# Altium footprint library Universal components.PcbLib: 101 footprints (part 7 of 7)
Each footprint in its own frame and in the unit in brackets; x right, y up, seen from the top. Pads: shape width x height; smd on the part's side, far side on the other; paste and mask are expansions set on the pad; w line width, h text height; cw(c..) or ccw(c..) is an arc to the next point about the centre after c.
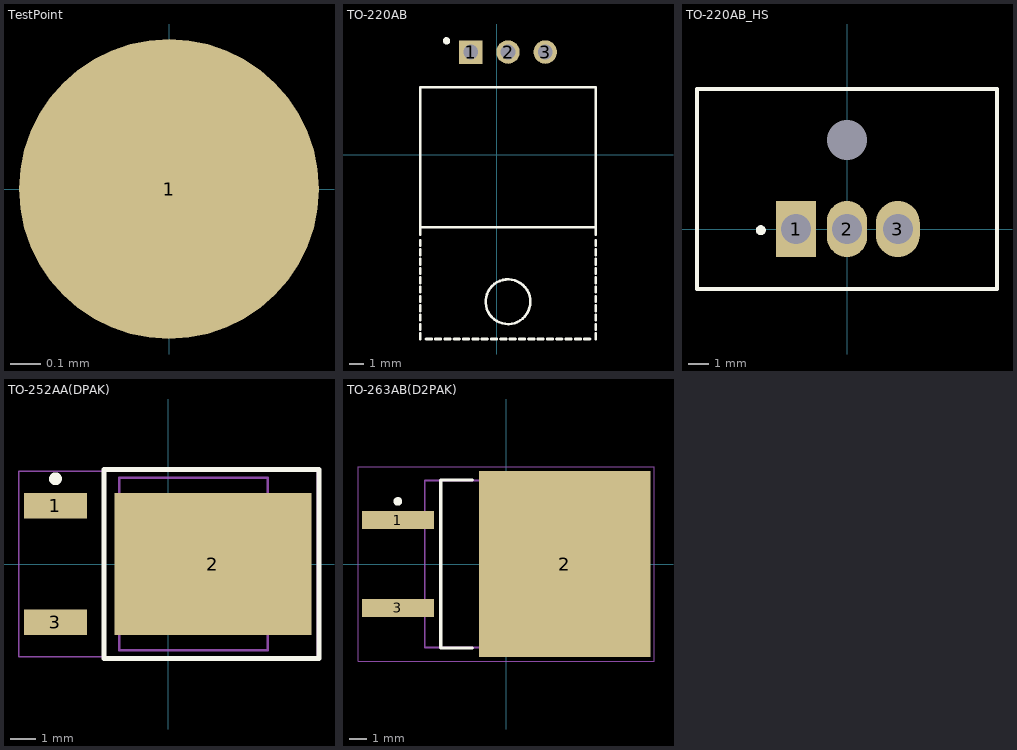
[diagram p6: the footprints below, top view; thin cyan lines are the x and y axes]

## TestPoint [mm]
pads (1):
  round 1 smd: 1(0,0)

## TO-220AB [mm]
pads (3):
  rect 1.6x1.6 hole 1: 1(-1.778,6.985)
  round 1.6 hole 1: 2(0.762,6.985) 3(3.302,6.985)
Top Overlay:
  circle w0.25: c-3.429,7.747 r0.125
  lines w0.178: -5.207,-12.573 -5.207,-12.192 ; -5.207,-11.938 -5.207,-11.557 ; -5.207,-11.303 -5.207,-10.922 ; -5.207,-10.668 -5.207,-10.287 ; -5.207,-10.033 -5.207,-9.652 ; -5.207,-9.398 -5.207,-9.017 ; -5.207,-8.763 -5.207,-8.382 ; -5.207,-8.128 -5.207,-7.747 ; -5.207,-7.493 -5.207,-7.112 ; -5.207,-6.858 -5.207,-6.477 ; -5.207,-6.223 -5.207,-5.842 ; -5.207,-5.461 -5.207,-4.953 ; -4.826,-12.573 -4.445,-12.573 ; -4.191,-12.573 -3.81,-12.573 ; -3.556,-12.573 -3.175,-12.573 ; -2.921,-12.573 -2.54,-12.573 ; -2.286,-12.573 -1.905,-12.573 ; -1.651,-12.573 -1.27,-12.573 ; -1.016,-12.573 -0.635,-12.573 ; -0.381,-12.573 0,-12.573 ; 0.254,-12.573 0.635,-12.573 ; 0.889,-12.573 1.27,-12.573 ; 1.524,-12.573 1.905,-12.573 ; 2.054,-9.225 ccw(c0.762,-10.033) 2.069,-9.249 ; 2.159,-12.573 2.54,-12.573 ; 2.794,-12.573 3.175,-12.573 ; 3.429,-12.573 3.81,-12.573 ; 4.064,-12.573 4.445,-12.573 ; 4.699,-12.573 5.08,-12.573 ; 5.334,-12.573 5.715,-12.573 ; 5.969,-12.573 6.35,-12.573 ; 6.731,-12.573 6.731,-12.192 ; 6.731,-11.938 6.731,-11.557 ; 6.731,-11.303 6.731,-10.922 ; 6.731,-10.668 6.731,-10.287 ; 6.731,-10.033 6.731,-9.652 ; 6.731,-9.398 6.731,-9.017 ; 6.731,-8.763 6.731,-8.382 ; 6.731,-8.128 6.731,-7.747 ; 6.731,-7.493 6.731,-7.112 ; 6.731,-6.858 6.731,-6.477 ; 6.731,-6.223 6.731,-5.842 ; 6.731,-5.461 6.731,-4.953 ; -5.207,-4.953 6.731,-4.953 ; -5.207,-4.953 -5.207,4.572 6.731,4.572 6.731,-4.953
Mechanical 15:
  lines w0.1: 0.262,6.985 1.262,6.985 ; 0.762,6.485 0.762,7.485
3D body "TO-220-3 Bend Mirror.stp": height 4.41, standoff -3, extent -5.18,-12.609 6.704,7.235

## TO-220AB_HS [mm]
pads (4):
  round 0 hole 2 unplated paste+0 mask+1: 0(0,4.45)
  rect 2x2.8 hole 1.5: 1(-2.54,0)
  oval 2x2.8 hole 1.5: 2(0,0)
  oval 2.2x2.8 hole 1.5: 3(2.54,0)
Top Overlay:
  circle w0.25: c-4.31,-0.06 r0.125
  lines w0.2: -7.5,-3 -7.5,7 7.5,7 7.5,-3 -7.5,-3
Mechanical 15:
  lines w0.1: -0.5,0 0.5,0 ; 0,-0.5 0,0.5
3D body "散热片.stp": height 16, standoff 0, extent -7.5,-3 7.5,7
3D body "User Library-TO-220AB.STEP": height 16.41, standoff -7.45, extent -5.34,-2.215 5.33,2.615

## TO-252AA(DPAK) [mm] "D-PAK, 3-Pads, Body 6.00x6.73mm (max), IPC Medium Density"
height 2.38
pads (3):
  rect 2.45x1 smd: 1(-4.4,2.28) 3(-4.4,-2.28)
  rect 7.7x5.55 smd: 2(1.75,0)
Top Overlay:
  circle w0.25: c-4.4,3.33 r0.125
  lines w0.2: -2.5,-3.7 5.9,-3.7 5.9,3.7 -2.5,3.7 -2.5,-3.7
Mechanical 13:
  lines w0.1: -1.9,-3.375 3.9,-3.375 3.9,3.375 -1.9,3.375 -1.9,-3.375
Mechanical 15:
  lines w0.05: -5.825,-3.625 5.825,-3.625 5.825,3.625 -5.825,3.625 -5.825,-3.625
  lines w0.1: -0.5,0 0.5,0 ; 0,-0.5 0,0.5
3D body "TO-252.STEP": height 2.44, standoff 0.03, extent -4.911,-3.27 5.028,3.27

## TO-263AB(D2PAK) [mm] "D2-PAK, 3-Pads, Body 8.44x8.19mm (max), IPC Medium Density"
height 4.83
pads (3):
  rect 4.15x1.05 smd: 1(-6.25,2.54) 3(-6.25,-2.54)
  rect 9.9x10.75 smd: 2(3.4,0)
Top Overlay:
  circle w0.25: c-6.25,3.615 r0.125
  lines w0.2: -1.95,-4.85 -3.775,-4.85 -3.775,4.85 -1.95,4.85
Mechanical 13:
  lines w0.1: -4.7,-4.825 5.97,-4.825 5.97,4.825 -4.7,4.825 -4.7,-4.825
Mechanical 15:
  lines w0.05: -8.55,-5.625 8.55,-5.625 8.55,5.625 -8.55,5.625 -8.55,-5.625
  lines w0.1: -0.5,0 0.5,0 ; 0,-0.5 0,0.5
3D body "User Library-DPAK.step": height 4.98, standoff -0.03, extent -7.576,-5.08 7.688,5.08